# Altium integrated library Quectel.IntLib: 26 symbols
Pins are listed as number, name and electrical type; pins without a type are passive.

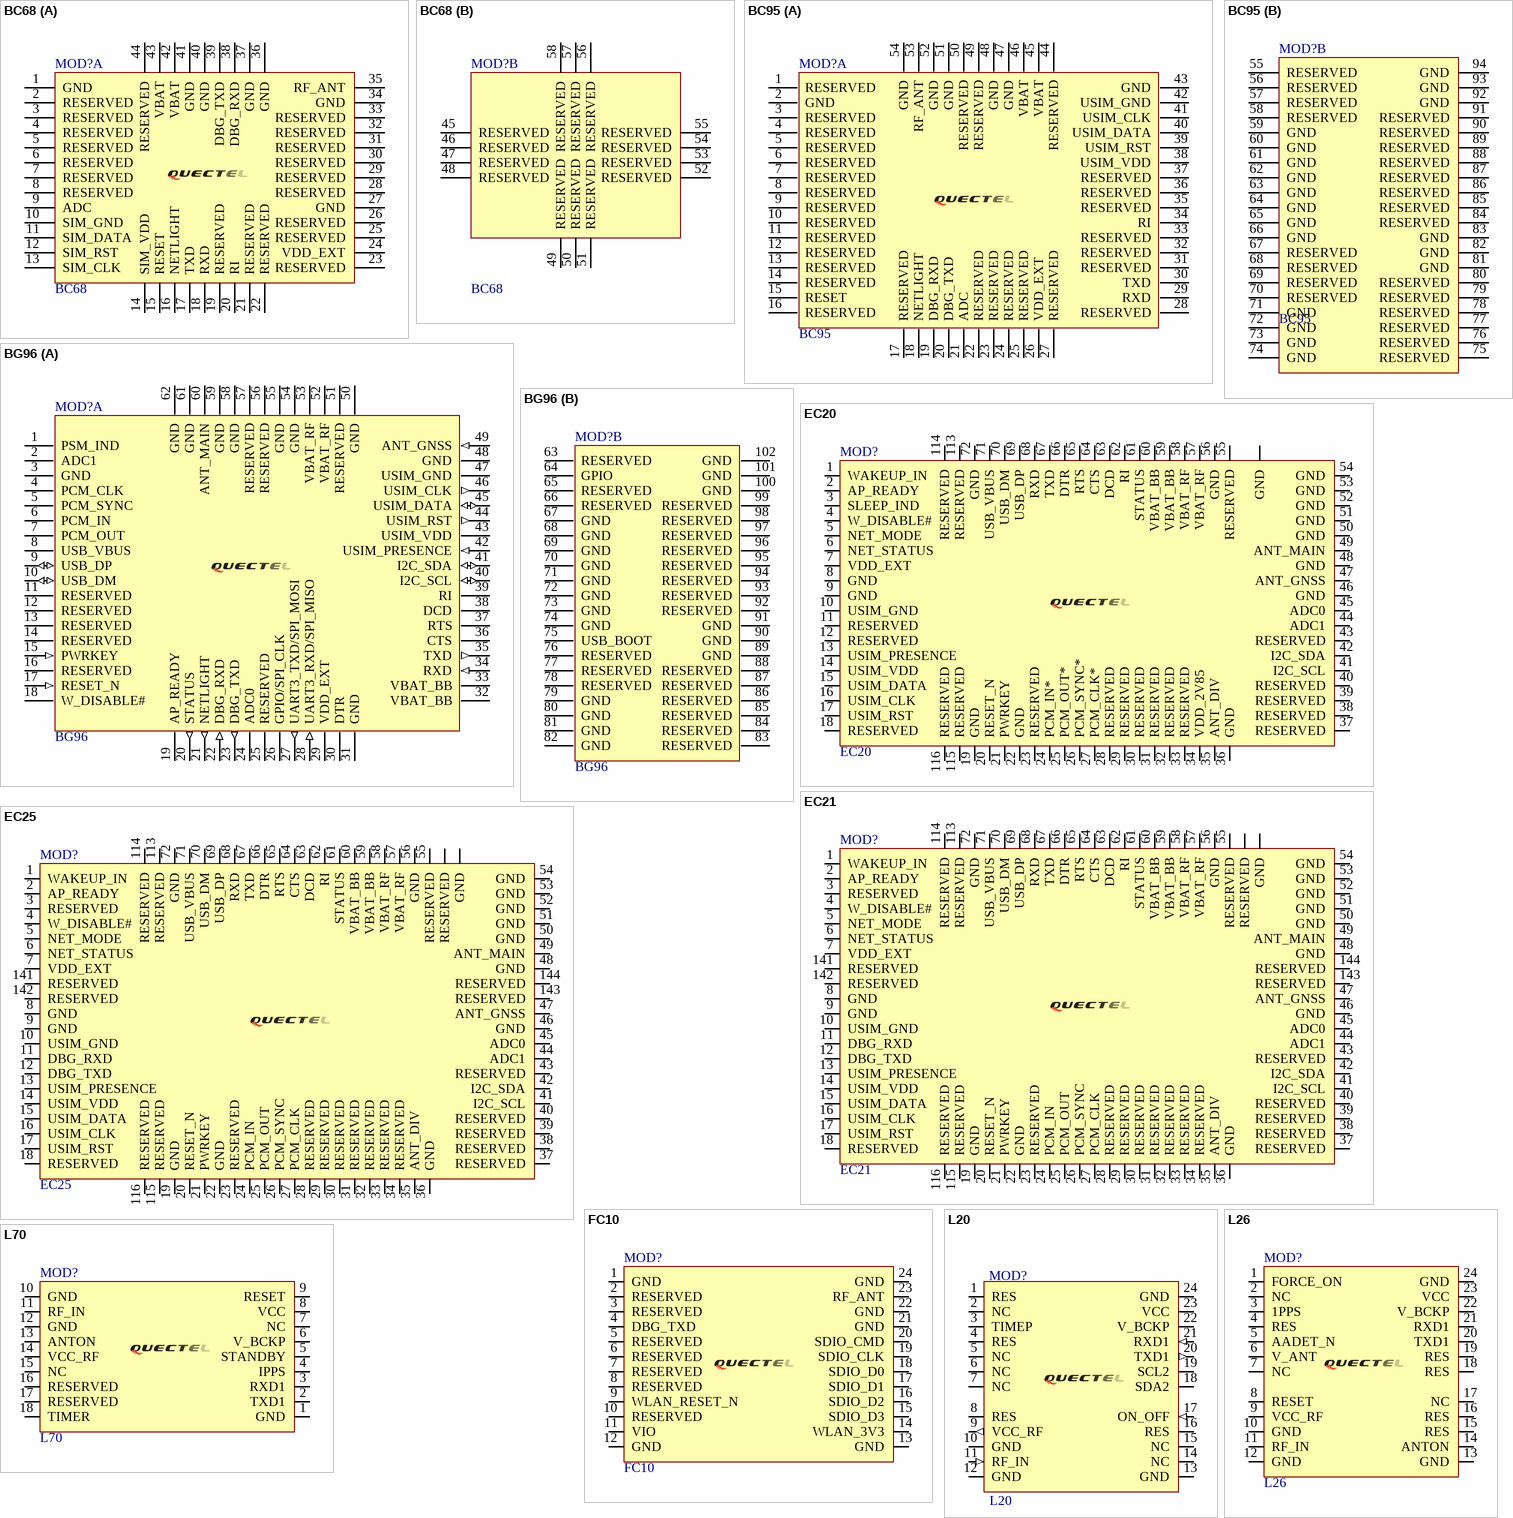
[diagram p0: symbols BC68 to L70]

## BC68
designator MOD?
NB-IoT module; Manuf1: Quectel; Populated: Yes; ReferencePackage: LCC; Value: BC68; ComponentLink1Description: Datasheet; LifeCycle: Checked; Manuf1Partnumber: BC68; PackageReference: LCC; ROHS: Yes; Supplier 1: Quectel; Supplier 1 Part Number: BC68
footprint BC68 (BC68 15.8X17.7mm H2.05mm RO)
part A pins: 1 GND, 2 RESERVED, 3 RESERVED, 4 RESERVED, 5 RESERVED, 6 RESERVED, 7 RESERVED, 8 RESERVED, 9 ADC, 10 SIM_GND, 11 SIM_DATA, 12 SIM_RST, 13 SIM_CLK, 14 SIM_VDD, 15 RESET, 16 NETLIGHT, 17 TXD, 18 RXD, 19 RESERVED, 20 RI, 21 RESERVED, 22 RESERVED, 23 RESERVED, 24 VDD_EXT, 25 RESERVED, 26 RESERVED, 27 GND, 28 RESERVED, 29 RESERVED, 30 RESERVED, 31 RESERVED, 32 RESERVED, 33 RESERVED, 34 GND, 35 RF_ANT, 36 GND, 37 GND, 38 DBG_RXD, 39 DBG_TXD, 40 GND, 41 GND, 42 VBAT, 43 VBAT, 44 RESERVED
part B pins: 45 RESERVED, 46 RESERVED, 47 RESERVED, 48 RESERVED, 49 RESERVED, 50 RESERVED, 51 RESERVED, 52 RESERVED, 53 RESERVED, 54 RESERVED, 55 RESERVED, 56 RESERVED, 57 RESERVED, 58 RESERVED

## BC95
designator MOD?
LTE NB-IoT Module; Manuf1: Quectel; Populated: Yes; ReferencePackage: LCC; Value: BC95; ComponentLink1Description: Datasheet; LifeCycle: Checked; Manuf1Partnumber: BC95; PackageReference: LCC; ROHS: Yes; Supplier 1: Quectel; Supplier 1 Part Number: BC95
footprint BC95
part A pins: 1 RESERVED, 2 GND, 3 RESERVED, 4 RESERVED, 5 RESERVED, 6 RESERVED, 7 RESERVED, 8 RESERVED, 9 RESERVED, 10 RESERVED, 11 RESERVED, 12 RESERVED, 13 RESERVED, 14 RESERVED, 15 RESET, 16 RESERVED, 17 RESERVED, 18 NETLIGHT, 19 DBG_RXD, 20 DBG_TXD, 21 ADC, 22 RESERVED, 23 RESERVED, 24 RESERVED, 25 RESERVED, 26 VDD_EXT, 27 RESERVED, 28 RESERVED, 29 RXD, 30 TXD, 31 RESERVED, 32 RESERVED, 33 RESERVED, 34 RI, 35 RESERVED, 36 RESERVED, 37 RESERVED, 38 USIM_VDD, 39 USIM_RST, 40 USIM_DATA, 41 USIM_CLK, 42 USIM_GND, 43 GND, 44 RESERVED, 45 VBAT, 46 VBAT, 47 GND, 48 GND, 49 RESERVED, 50 RESERVED, 51 GND, 52 GND, 53 RF_ANT, 54 GND
part B pins: 55 RESERVED, 56 RESERVED, 57 RESERVED, 58 RESERVED, 59 GND, 60 GND, 61 GND, 62 GND, 63 GND, 64 GND, 65 GND, 66 GND, 67 RESERVED, 68 RESERVED, 69 RESERVED, 70 RESERVED, 71 GND, 72 GND, 73 GND, 74 GND, 75 RESERVED, 76 RESERVED, 77 RESERVED, 78 RESERVED, 79 RESERVED, 80 RESERVED, 81 GND, 82 GND, 83 GND, 84 RESERVED, 85 RESERVED, 86 RESERVED, 87 RESERVED, 88 RESERVED, 89 RESERVED, 90 RESERVED, 91 RESERVED, 92 GND, 93 GND, 94 GND
2 alternate drawings of the same symbol

## BG96
designator MOD?
LTE Cat M1/Cat NB1/EGPRS module; Manuf1: Quectel; Populated: Yes; ReferencePackage: LCC; Value: BG96; ComponentLink1Description: Datasheet; LifeCycle: Checked; Manuf1Partnumber: BG96; PackageReference: LCC; ROHS: Yes; Supplier 1: Quectel; Supplier 1 Part Number: BG96
footprint BG96
part A pins: 1 PSM_IND, 2 ADC1, 3 GND, 4 PCM_CLK, 5 PCM_SYNC, 6 PCM_IN, 7 PCM_OUT, 8 USB_VBUS, 9 USB_DP (io), 10 USB_DM (io), 11 RESERVED, 12 RESERVED, 13 RESERVED, 14 RESERVED, 15 PWRKEY (in), 16 RESERVED, 17 RESET_N (in), 18 W_DISABLE#, 19 AP_READY, 20 STATUS (out), 21 NETLIGHT (out), 22 DBG_RXD (in), 23 DBG_TXD (out), 24 ADC0, 25 RESERVED, 26 GPIO/SPI_CLK, 27 UART3_TXD/SPI_MOSI (out), 28 UART3_RXD/SPI_MISO (in), 29 VDD_EXT, 30 DTR, 31 GND, 32 VBAT_BB, 33 VBAT_BB, 34 RXD (in), 35 TXD (out), 36 CTS, 37 RTS, 38 DCD, 39 RI, 40 I2C_SCL (io), 41 I2C_SDA (io), 42 USIM_PRESENCE (in), 43 USIM_VDD, 44 USIM_RST (out), 45 USIM_DATA (io), 46 USIM_CLK (out), 47 USIM_GND, 48 GND, 49 ANT_GNSS (in), 50 GND, 51 RESERVED, 52 VBAT_RF, 53 VBAT_RF, 54 GND, 55 GND, 56 RESERVED, 57 RESERVED, 58 GND, 59 GND, 60 ANT_MAIN, 61 GND, 62 GND
part B pins: 63 RESERVED, 64 GPIO, 65 RESERVED, 66 RESERVED, 67 GND, 68 GND, 69 GND, 70 GND, 71 GND, 72 GND, 73 GND, 74 GND, 75 USB_BOOT, 76 RESERVED, 77 RESERVED, 78 RESERVED, 79 GND, 80 GND, 81 GND, 82 GND, 83 RESERVED, 84 RESERVED, 85 RESERVED, 86 RESERVED, 87 RESERVED, 88 RESERVED, 89 GND, 90 GND, 91 GND, 92 RESERVED, 93 RESERVED, 94 RESERVED, 95 RESERVED, 96 RESERVED, 97 RESERVED, 98 RESERVED, 99 RESERVED, 100 GND, 101 GND, 102 GND

## EC20
designator MOD?
LTE module; Manuf1: Quectel; Populated: Yes; ReferencePackage: LCC; LifeCycle: Checked; Manuf1Partnumber: EC20; PackageReference: LCC; ROHS: Yes; Supplier 1: Quectel; Supplier 1 Part Number: EC20; Value: EC20; ComponentLink1Description: Datasheet; ComponentLink1URL: http://www.quectel.com/UploadImage/Downlad/Quectel_EC20_Hardware_Design_V1.2.pdf
footprint EC20
pins: 1 WAKEUP_IN, 2 AP_READY, 3 SLEEP_IND, 4 W_DISABLE#, 5 NET_MODE, 6 NET_STATUS, 7 VDD_EXT, 8 GND, 9 GND, 10 USIM_GND, 11 RESERVED, 12 RESERVED, 13 USIM_PRESENCE, 14 USIM_VDD, 15 USIM_DATA, 16 USIM_CLK, 17 USIM_RST, 18 RESERVED, 19 GND, 20 RESET_N, 21 PWRKEY, 22 GND, 23 RESERVED, 24 PCM_IN*, 25 PCM_OUT*, 26 PCM_SYNC*, 27 PCM_CLK*, 28 RESERVED, 29 RESERVED, 30 RESERVED, 31 RESERVED, 32 RESERVED, 33 RESERVED, 34 VDD_2V85, 35 ANT_DIV, 36 GND, 37 RESERVED, 38 RESERVED, 39 RESERVED, 40 RESERVED, 41 I2C_SCL, 42 I2C_SDA, 43 RESERVED, 44 ADC1, 45 ADC0, 46 GND, 47 ANT_GNSS, 48 GND, 49 ANT_MAIN, 50 GND, 51 GND, 52 GND, 53 GND, 54 GND, 55 RESERVED, 56 GND, 57 VBAT_RF, 58 VBAT_RF, 59 VBAT_BB, 60 VBAT_BB, 61 STATUS, 62 RI, 63 DCD, 64 CTS, 65 RTS, 66 DTR, 67 TXD, 68 RXD, 69 USB_DP, 70 USB_DM, 71 USB_VBUS, 72 GND, 85, 86, 87, 88, 89, 90, 91, 92, 93, 94, 95, 96, 97, 98, 99, 100, 101, 102, 103, 104, 105, 106, 107, 108, 109, 110, 111, 112 GND, 113 RESERVED, 114 RESERVED, 115 RESERVED, 116 RESERVED

## EC21
designator MOD?
LTE category-1 module; Manuf1: Quectel; Populated: Yes; ReferencePackage: LCC; Value: EC21; ComponentLink1Description: Datasheet; ComponentLink1URL: http://www.quectel.com/UploadImage/Downlad/Quectel_EC21_Hardware_Design_V1.0.pdf; LifeCycle: Checked; Manuf1Partnumber: EC21; PackageReference: LCC; ROHS: Yes; Supplier 1: Quectel; Supplier 1 Part Number: EC21
footprint EC21
pins: 1 WAKEUP_IN, 2 AP_READY, 3 RESERVED, 4 W_DISABLE#, 5 NET_MODE, 6 NET_STATUS, 7 VDD_EXT, 8 GND, 9 GND, 10 USIM_GND, 11 DBG_RXD, 12 DBG_TXD, 13 USIM_PRESENCE, 14 USIM_VDD, 15 USIM_DATA, 16 USIM_CLK, 17 USIM_RST, 18 RESERVED, 19 GND, 20 RESET_N, 21 PWRKEY, 22 GND, 23 RESERVED, 24 PCM_IN, 25 PCM_OUT, 26 PCM_SYNC, 27 PCM_CLK, 28 RESERVED, 29 RESERVED, 30 RESERVED, 31 RESERVED, 32 RESERVED, 33 RESERVED, 34 RESERVED, 35 ANT_DIV, 36 GND, 37 RESERVED, 38 RESERVED, 39 RESERVED, 40 RESERVED, 41 I2C_SCL, 42 I2C_SDA, 43 RESERVED, 44 ADC1, 45 ADC0, 46 GND, 47 ANT_GNSS, 48 GND, 49 ANT_MAIN, 50 GND, 51 GND, 52 GND, 53 GND, 54 GND, 55 RESERVED, 56 GND, 57 VBAT_RF, 58 VBAT_RF, 59 VBAT_BB, 60 VBAT_BB, 61 STATUS, 62 RI, 63 DCD, 64 CTS, 65 RTS, 66 DTR, 67 TXD, 68 RXD, 69 USB_DP, 70 USB_DM, 71 USB_VBUS, 72 GND, 85, 86, 87, 88, 89, 90, 91, 92, 93, 94, 95, 96, 97, 98, 99, 100, 101, 102, 103, 104, 105, 106, 107, 108, 109, 110, 111, 112 GND, 113 RESERVED, 114 RESERVED, 115 RESERVED, 116 RESERVED, 117, 118, 119, 120, 121, 122, 123, 124, 125, 126, 127, 128, 129, 130, 131, 132, 133, 134, 135, 136, 137, 138, 139, 140 RESERVED, 141 RESERVED, 142 RESERVED, 143 RESERVED, 144 RESERVED

## EC25
designator MOD?
LTE category-4 module; Manuf1: Quectel; Populated: Yes; ReferencePackage: LCC; Value: EC25; ComponentLink1Description: Datasheet; ComponentLink1URL: http://www.quectel.com/UploadImage/Downlad/Quectel_EC25_Hardware_Design_V1.0.pdf; LifeCycle: Checked; Manuf1Partnumber: EC25; PackageReference: LCC; ROHS: Yes; Supplier 1: Quectel; Supplier 1 Part Number: EC25
footprint EC25
pins: 1 WAKEUP_IN, 2 AP_READY, 3 RESERVED, 4 W_DISABLE#, 5 NET_MODE, 6 NET_STATUS, 7 VDD_EXT, 8 GND, 9 GND, 10 USIM_GND, 11 DBG_RXD, 12 DBG_TXD, 13 USIM_PRESENCE, 14 USIM_VDD, 15 USIM_DATA, 16 USIM_CLK, 17 USIM_RST, 18 RESERVED, 19 GND, 20 RESET_N, 21 PWRKEY, 22 GND, 23 RESERVED, 24 PCM_IN, 25 PCM_OUT, 26 PCM_SYNC, 27 PCM_CLK, 28 RESERVED, 29 RESERVED, 30 RESERVED, 31 RESERVED, 32 RESERVED, 33 RESERVED, 34 RESERVED, 35 ANT_DIV, 36 GND, 37 RESERVED, 38 RESERVED, 39 RESERVED, 40 RESERVED, 41 I2C_SCL, 42 I2C_SDA, 43 RESERVED, 44 ADC1, 45 ADC0, 46 GND, 47 ANT_GNSS, 48 GND, 49 ANT_MAIN, 50 GND, 51 GND, 52 GND, 53 GND, 54 GND, 55 RESERVED, 56 GND, 57 VBAT_RF, 58 VBAT_RF, 59 VBAT_BB, 60 VBAT_BB, 61 STATUS, 62 RI, 63 DCD, 64 CTS, 65 RTS, 66 DTR, 67 TXD, 68 RXD, 69 USB_DP, 70 USB_DM, 71 USB_VBUS, 72 GND, 85, 86, 87, 88, 89, 90, 91, 92, 93, 94, 95, 96, 97, 98, 99, 100, 101, 102, 103, 104, 105, 106, 107, 108, 109, 110, 111, 112 GND, 113 RESERVED, 114 RESERVED, 115 RESERVED, 116 RESERVED, 117, 118, 119, 120, 121, 122, 123, 124, 125, 126, 127, 128, 129, 130, 131, 132, 133, 134, 135, 136, 137, 138, 139, 140 RESERVED, 141 RESERVED, 142 RESERVED, 143 RESERVED, 144 RESERVED

## FC10
designator MOD?
embedded Wi-Fi wireless solution; Manuf1: Quectel; Populated: Yes; ReferencePackage: LCC; LifeCycle: Checked; Manuf1Partnumber: FC10; PackageReference: LCC; ROHS: Yes; Supplier 1: Quectel; Supplier 1 Part Number: FC10; Value: FC10; ComponentLink1Description: Datasheet; ComponentLink1URL: http://www.quectel.com/UploadImage/Downlad/Quectel_FC10_Hardware_Design_V1.0.pdf
footprint FC10
pins: 1 GND, 2 RESERVED, 3 RESERVED, 4 DBG_TXD, 5 RESERVED, 6 RESERVED, 7 RESERVED, 8 RESERVED, 9 WLAN_RESET_N, 10 RESERVED, 11 VIO, 12 GND, 13 GND, 14 WLAN_3V3, 15 SDIO_D3, 16 SDIO_D2, 17 SDIO_D1, 18 SDIO_D0, 19 SDIO_CLK, 20 SDIO_CMD, 21 GND, 22 GND, 23 RF_ANT, 24 GND

## L20
designator MOD?
GPS receiver module; Manuf1: Quectel; Populated: Yes; ReferencePackage: LCC; Value: L20; Manuf1Partnumber: L20; ROHS: Yes; HelpURL: http://www.quectel.com/es/product/prodetail.aspx?id=10; LifeCycle: Checked; Supplier 1 Part Number: L20; Supplier 1: Quectel; PackageReference: LCC; ComponentLink1Description: Datasheet; ComponentLink1URL: http://www.quectel.com/UploadImage/Downlad/Quectel_L20_Hardware_Design_V2.2.pdf
footprint L20
pins: 1 RES, 2 NC, 3 TIMEP, 4 RES, 5 NC, 6 NC, 7 NC, 8 RES, 9 VCC_RF (out), 10 GND (power), 11 RF_IN (in), 12 GND (power), 13 GND (power), 14 NC, 15 NC, 16 RES, 17 ON_OFF (in), 18 SDA2 (io), 19 SCL2 (io), 20 TXD1 (out), 21 RXD1 (in), 22 V_BCKP (power), 23 VCC (power), 24 GND (power)

## L26
designator MOD?
GPS receiver module; Manuf1: Quectel; Populated: Yes; ReferencePackage: LCC; Value: L26; LifeCycle: Checked; Manuf1Partnumber: L26; PackageReference: LCC; ROHS: Yes; Supplier 1: Quectel; Supplier 1 Part Number: L26; ComponentLink1Description: Datasheet; ComponentLink1URL: http://www.quectel.com/UploadImage/Downlad/Quectel_L26_Hardware_Design_V1.3.pdf
footprint L26
pins: 1 FORCE_ON, 2 NC, 3 1PPS, 4 RES, 5 AADET_N, 6 V_ANT, 7 NC, 8 RESET, 9 VCC_RF, 10 GND, 11 RF_IN, 12 GND, 13 GND, 14 ANTON, 15 RES, 16 RES, 17 NC, 18 RES, 19 RES, 20 TXD1, 21 RXD1, 22 V_BCKP, 23 VCC, 24 GND

## L70
designator MOD?
GPS receiver module; Manuf1: Quectel; Populated: Yes; ReferencePackage: LCC; Value: L70; LifeCycle: Checked; Manuf1Partnumber: L70; PackageReference: LCC; ROHS: Yes; Supplier 1: Quectel; Supplier 1 Part Number: L70; ComponentLink1Description: Datasheet; ComponentLink1URL: http://www.quectel.com/UploadImage/Downlad/Quectel_L70_Hardware_Design_V2.3.pdf
footprint L7x
pins: 1 GND, 2 TXD1, 3 RXD1, 4 IPPS, 5 STANDBY, 6 V_BCKP, 7 NC, 8 VCC, 9 RESET, 10 GND, 11 RF_IN, 12 GND, 13 ANTON, 14 VCC_RF, 15 NC, 16 RESERVED, 17 RESERVED, 18 TIMER

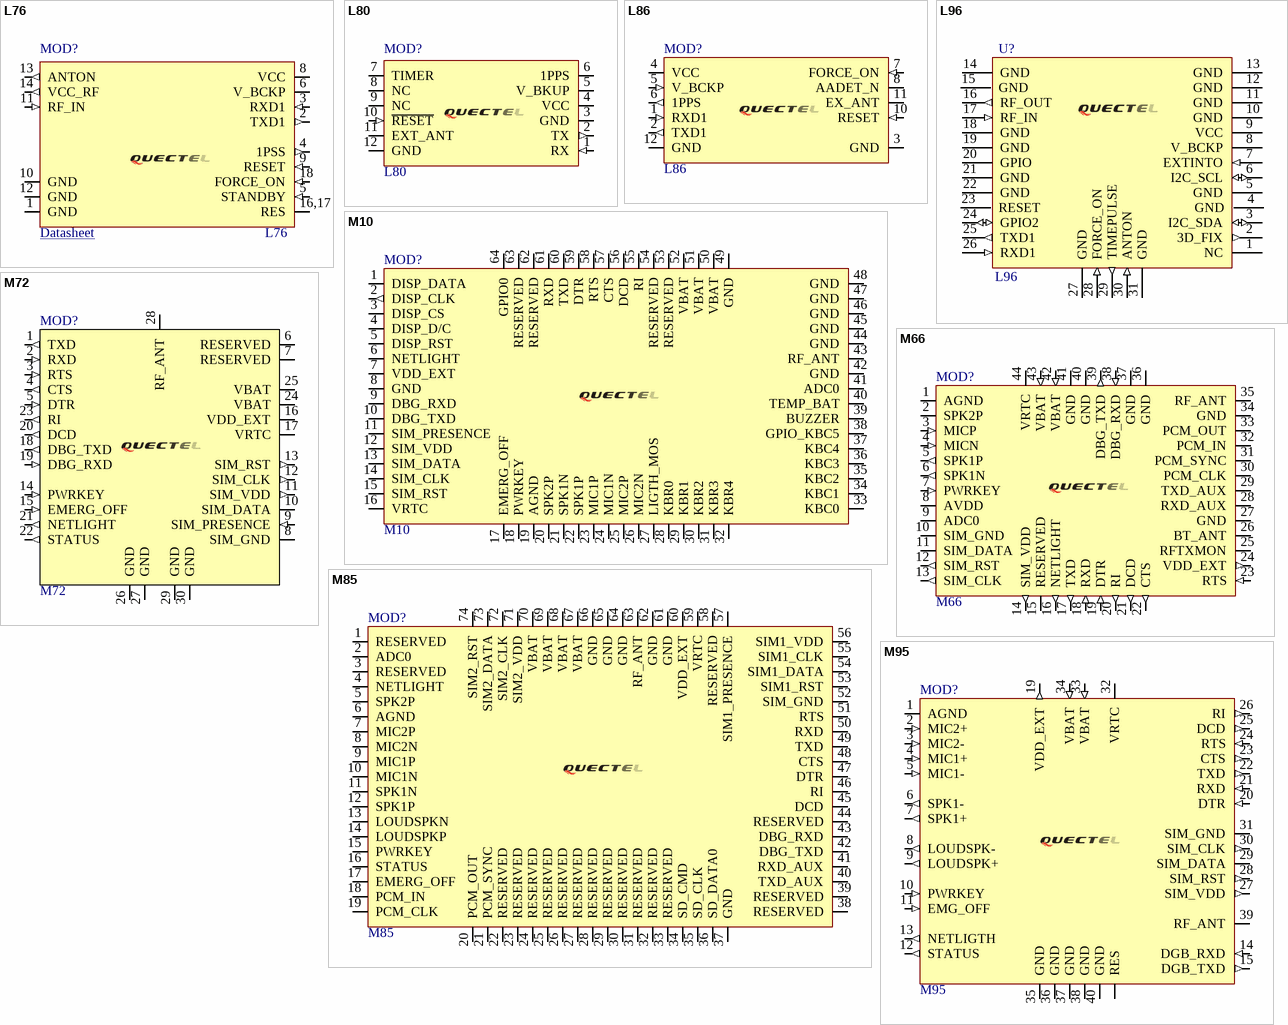
[diagram p1: symbols L76 to M95]

## L76
designator MOD?
GNSS receiver module; Manuf1: Quectel; Populated: Yes; ReferencePackage: LCC; Value: L76; ROHS: Yes; PackageReference: LCC; LifeCycle: Checked; Supplier 1 Part Number: L76; Supplier 1: Quectel; Manuf1Partnumber: L76; ComponentLink1Description: Datasheet
footprint L7x
pins: 1 GND (power), 2 TXD1 (out), 3 RXD1 (in), 4 1PSS (out), 5 STANDBY (in), 6 V_BCKP (power), 8 VCC (power), 9 RESET (in), 10 GND (power), 11 RF_IN (in), 12 GND (power), 13 ANTON (out), 14 VCC_RF (out), 16,17 RES, 18 FORCE_ON (in)

## L80
designator MOD?  (net tie)
GPS POT (Patch on Top) module with an embedded patch antenna; Manuf1: Quectel; Populated: Yes; ReferencePackage: LCC; Value: L80; Manuf1Partnumber: L80; ROHS: Yes; HelpURL: http://www.quectel.com/es/product/prodetail.aspx?id=62; LifeCycle: Checked; Supplier 1 Part Number: L80; Supplier 1: Quectel; PackageReference: LCC; ComponentLink1Description: Datasheet; ComponentLink1URL: http://www.quectel.com/UploadImage/Downlad/Quectel_L80_Hardware_Design_V1.4.pdf
footprint L80
pins: 1 RX (in), 2 TX (out), 3 GND (power), 4 VCC (power), 5 V_BKUP (power), 6 1PPS, 7 TIMER, 8 NC, 9 NC, 10 ~{RESET} (in), 11 EXT_ANT (io), 12 GND (power)

## L86
designator MOD?
GNSS POT (Patch on Top) module with an embedded patch antenna; Manuf1: Quectel; Populated: Yes; ReferencePackage: LCC; Value: L86; LifeCycle: Checked; Manuf1Partnumber: L86; PackageReference: LCC; ROHS: Yes; Supplier 1: Quectel; Supplier 1 Part Number: L86; ComponentLink1Description: Datasheet; ComponentLink1URL: http://www.quectel.com/UploadImage/Downlad/Quectel_L86_Hardware_Design_V1.2.pdf
footprint L86
pins: 1 RXD1 (in), 2 TXD1 (out), 3 GND (power), 4 VCC, 5 V_BCKP (in), 6 1PPS (out), 7 FORCE_ON (in), 8 AADET_N, 10 RESET (in), 11 EX_ANT (io), 12 GND (power)

## L96
designator U?
Concurrent multi-GNSS receiver module; Manuf1: Quectel; Populated: Yes; ReferencePackage: LCC; Value: L96; ComponentLink1Description: Datasheet; LifeCycle: Checked; Manuf1Partnumber: L96; PackageReference: LCC; ROHS: Yes; Supplier 1: Quectel; Supplier 1 Part Number: L96
footprint L96
pins: 1 NC, 2 3D_FIX (out), 3 I2C_SDA (io), 4 GND, 5 GND, 6 I2C_SCL (io), 7 EXTINTO (in), 8 V_BCKP, 9 VCC, 10 GND, 11 GND, 12 GND, 13 GND, 14 GND, 15 GND, 16 RF_OUT (out), 17 RF_IN (in), 18 GND, 19 GND, 20 GPIO, 21 GND, 22 GND, 23 RESET, 24 GPIO2 (io), 25 TXD1 (out), 26 RXD1 (in), 27 GND, 28 FORCE_ON (in), 29 TIMEPULSE (out), 30 ANTON (in), 31 GND

## M10
designator MOD?
Quad-band GSM/GPRS module; Manuf1: Quectel; Populated: Yes; ReferencePackage: LCC; Manuf1PartNumber: M10; ROHS: Yes; LifeCycle: Checked; Value: M10; Supplier 1: Quectel; Supplier 1 Part Number: M10; PackageReference: LCC; ComponentLink1Description: Datasheet; ComponentLink1URL: http://www.quectel.com/UploadImage/Downlad/Quectel_M10_Hardware_Design_V4.0.pdf
footprint M10
pins: 1 DISP_DATA (io), 2 DISP_CLK (out), 3 DISP_CS, 4 DISP_D/C, 5 DISP_RST, 6 NETLIGHT, 7 VDD_EXT, 8 GND, 9 DBG_RXD, 10 DBG_TXD, 11 SIM_PRESENCE, 12 SIM_VDD, 13 SIM_DATA, 14 SIM_CLK, 15 SIM_RST, 16 VRTC, 17 EMERG_OFF, 18 PWRKEY, 19 AGND, 20 SPK2P, 21 SPK1N, 22 SPK1P, 23 MIC1P, 24 MIC1N, 25 MIC2P, 26 MIC2N, 27 LIGTH_MOS, 28 KBR0, 29 KBR1, 30 KBR2, 31 KBR3, 32 KBR4, 33 KBC0, 34 KBC1, 35 KBC2, 36 KBC3, 37 KBC4, 38 GPIO_KBC5, 39 BUZZER, 40 TEMP_BAT, 41 ADC0, 42 GND, 43 RF_ANT, 44 GND, 45 GND, 46 GND, 47 GND, 48 GND, 49 GND, 50 VBAT, 51 VBAT, 52 VBAT, 53 RESERVED, 54 RESERVED, 55 RI, 56 DCD, 57 CTS, 58 RTS, 59 DTR, 60 TXD, 61 RXD, 62 RESERVED, 63 RESERVED, 64 GPIO0

## M66
designator MOD?
Smallest Quad-band GSM/GPRS; Manuf1: Quectel; Populated: Yes; ReferencePackage: LCC; LifeCycle: Checked; Manuf1Partnumber: M66; PackageReference: LCC; ROHS: Yes; Supplier 1: Quectel; Supplier 1 Part Number: M66; Value: M66; ComponentLink1Description: Datasheet; ComponentLink1URL: http://www.quectel.com/UploadImage/Downlad/Quectel_M66_Hardware_Design_V1.1.pdf
footprint M66
pins: 1 AGND, 2 SPK2P, 3 MICP (in), 4 MICN (in), 5 SPK1P (out), 6 SPK1N (out), 7 PWRKEY (in), 8 AVDD, 9 ADC0, 10 SIM_GND, 11 SIM_DATA (io), 12 SIM_RST (out), 13 SIM_CLK (out), 14 SIM_VDD (out), 15 RESERVED, 16 NETLIGHT (out), 17 TXD (out), 18 RXD (in), 19 DTR (in), 20 RI (out), 21 DCD (out), 22 CTS (out), 23 RTS (in), 24 VDD_EXT (out), 25 RFTXMON, 26 BT_ANT, 27 GND (power), 28 RXD_AUX, 29 TXD_AUX, 30 PCM_CLK, 31 PCM_SYNC, 32 PCM_IN, 33 PCM_OUT, 34 GND (power), 35 RF_ANT (io), 36 GND (power), 37 GND (power), 38 DBG_RXD (in), 39 DBG_TXD (out), 40 GND (power), 41 GND (power), 42 VBAT (in), 43 VBAT (in), 44 VRTC (io)

## M72
designator MOD?
Dual-band 900/1800 GSM/GPRS module; Manuf1: Quectel; Populated: Yes; ReferencePackage: LCC; Value: M72; LifeCycle: Obsolete; Manuf1Partnumber: M72; PackageReference: LCC; ROHS: Yes; Supplier 1: Quectel; Supplier 1 Part Number: M72; ComponentLink1Description: Datasheet; ComponentLink1URL: http://www.quectel.com/UploadImage/Downlad/Quectel_M72_Hardware_Design_V4.1.pdf
footprint M72
pins: 1 TXD (out), 2 RXD (in), 3 RTS (in), 4 CTS (out), 5 DTR (in), 6 RESERVED, 7 RESERVED, 8 SIM_GND (power), 9 SIM_PRESENCE (in), 10 SIM_DATA (io), 11 SIM_VDD (out), 12 SIM_CLK (out), 13 SIM_RST (out), 14 PWRKEY (in), 15 EMERG_OFF (in), 16 VDD_EXT (power), 17 VRTC (power), 18 DBG_TXD (out), 19 DBG_RXD (in), 20 DCD (out), 21 NETLIGHT (out), 22 STATUS (out), 23 RI (out), 24 VBAT (power), 25 VBAT (power), 26 GND (power), 27 GND (power), 28 RF_ANT (io), 29 GND (power), 30 GND (power)

## M85
designator MOD?
Quad-band GSM/GPRS module; Manuf1: Quectel; Populated: Yes; ReferencePackage: LCC; Value: M85; LifeCycle: Checked; Manuf1Partnumber: M85; PackageReference: LCC; ROHS: Yes; Supplier 1: Quectel; Supplier 1 Part Number: M85; ComponentLink1Description: Datasheet; ComponentLink1URL: http://www.quectel.com/UploadImage/Downlad/Quectel_M85_Hardware_Design_V3.0.pdf
footprint M85
pins: 1 RESERVED, 2 ADC0, 3 RESERVED, 4 NETLIGHT, 5 SPK2P, 6 AGND, 7 MIC2P, 8 MIC2N, 9 MIC1P, 10 MIC1N, 11 SPK1N, 12 SPK1P, 13 LOUDSPKN, 14 LOUDSPKP, 15 PWRKEY, 16 STATUS, 17 EMERG_OFF, 18 PCM_IN, 19 PCM_CLK, 20 PCM_OUT, 21 PCM_SYNC, 22 RESERVED, 23 RESERVED, 24 RESERVED, 25 RESERVED, 26 RESERVED, 27 RESERVED, 28 RESERVED, 29 RESERVED, 30 RESERVED, 31 RESERVED, 32 RESERVED, 33 RESERVED, 34 SD_CMD, 35 SD_CLK, 36 SD_DATA0, 37 GND, 38 RESERVED, 39 RESERVED, 40 TXD_AUX, 41 RXD_AUX, 42 DBG_TXD, 43 DBG_RXD, 44 RESERVED, 45 DCD, 46 RI, 47 DTR, 48 CTS, 49 TXD, 50 RXD, 51 RTS, 52 SIM_GND, 53 SIM1_RST, 54 SIM1_DATA, 55 SIM1_CLK, 56 SIM1_VDD, 57 SIM1_PRESENCE, 58 RESERVED, 59 VRTC, 60 VDD_EXT, 61 GND, 62 GND, 63 RF_ANT, 64 GND, 65 GND, 66 GND, 67 VBAT, 68 VBAT, 69 VBAT, 70 VBAT, 71 SIM2_VDD, 72 SIM2_CLK, 73 SIM2_DATA, 74 SIM2_RST
2 alternate drawings of the same symbol

## M95
designator MOD?
Quad-band GSM/GPRS module; Manuf1: Quectel; Populated: Yes; ReferencePackage: LCC; Manuf1PartNumber: M95; ROHS: Yes; LifeCycle: Checked; HelpURL: http://www.quectel.com/es/product/prodetail.aspx?id=7; Value: M95; Supplier 1: Quectel; Supplier 1 Part Number: M95; PackageReference: LCC; ComponentLink1Description: Datasheet; ComponentLink1URL: http://www.quectel.com/UploadImage/Downlad/Quectel_M95_Hardware_Design_V3.1.pdf
footprint M95
pins: 1 AGND (power), 2 MIC2+ (in), 3 MIC2- (in), 4 MIC1+ (in), 5 MIC1- (in), 6 SPK1- (out), 7 SPK1+ (out), 8 LOUDSPK- (out), 9 LOUDSPK+ (out), 10 PWRKEY (in), 11 EMG_OFF (in), 12 STATUS (out), 13 NETLIGTH (out), 14 DGB_RXD (in), 15 DGB_TXD (out), 16, 17, 18 RES, 19 VDD_EXT (out), 20 DTR (in), 21 RXD (in), 22 TXD (out), 23 CTS (out), 24 RTS (in), 25 DCD (out), 26 RI (out), 27 SIM_VDD (out), 28 SIM_RST (out), 29 SIM_DATA (io), 30 SIM_CLK (out), 31 SIM_GND (power), 32 VRTC (io), 33 VBAT (in), 34 VBAT (in), 35 GND (power), 36 GND (power), 37 GND (power), 38 GND (power), 39 RF_ANT (io), 40 GND (power)

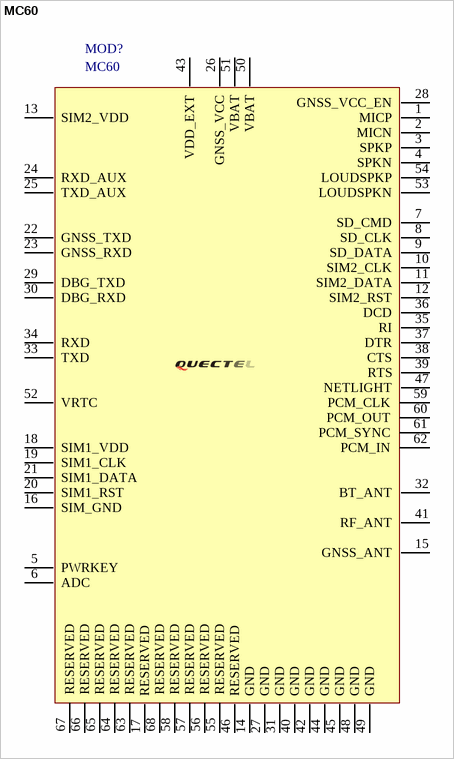
[diagram p2: symbol MC60]

## MC60
designator MOD?
Quad-band full-featured GSM/GPRS with GNSS; Manuf1: Quectel; Populated: Yes; ReferencePackage: LCC; ComponentLink1Description: Datasheet; LifeCycle: Checked; Manuf1Partnumber: MC60; PackageReference: LCC; ROHS: Yes; Supplier 1: Quectel; Supplier 1 Part Number: MC60; Value: MC60
footprint MC60
pins: 1 MICP, 2 MICN, 3 SPKP, 4 SPKN, 5 PWRKEY, 6 ADC, 7 SD_CMD, 8 SD_CLK, 9 SD_DATA, 10 SIM2_CLK, 11 SIM2_DATA, 12 SIM2_RST, 13 SIM2_VDD, 14 GND, 15 GNSS_ANT, 16 SIM_GND, 17 RESERVED, 18 SIM1_VDD, 19 SIM1_CLK, 20 SIM1_RST, 21 SIM1_DATA, 22 GNSS_TXD, 23 GNSS_RXD, 24 RXD_AUX, 25 TXD_AUX, 26 GNSS_VCC, 27 GND, 28 GNSS_VCC_EN, 29 DBG_TXD, 30 DBG_RXD, 31 GND, 32 BT_ANT, 33 TXD, 34 RXD, 35 RI, 36 DCD, 37 DTR, 38 CTS, 39 RTS, 40 GND, 41 RF_ANT, 42 GND, 43 VDD_EXT, 44 GND, 45 GND, 46 RESERVED, 47 NETLIGHT, 48 GND, 49 GND, 50 VBAT, 51 VBAT, 52 VRTC, 53 LOUDSPKN, 54 LOUDSPKP, 55 RESERVED, 56 RESERVED, 57 RESERVED, 58 RESERVED, 59 PCM_CLK, 60 PCM_OUT, 61 PCM_SYNC, 62 PCM_IN, 63 RESERVED, 64 RESERVED, 65 RESERVED, 66 RESERVED, 67 RESERVED, 68 RESERVED
